# Altium integrated library TI Power Management Battery Management.IntLib: 950 symbols (part 11 of 48)
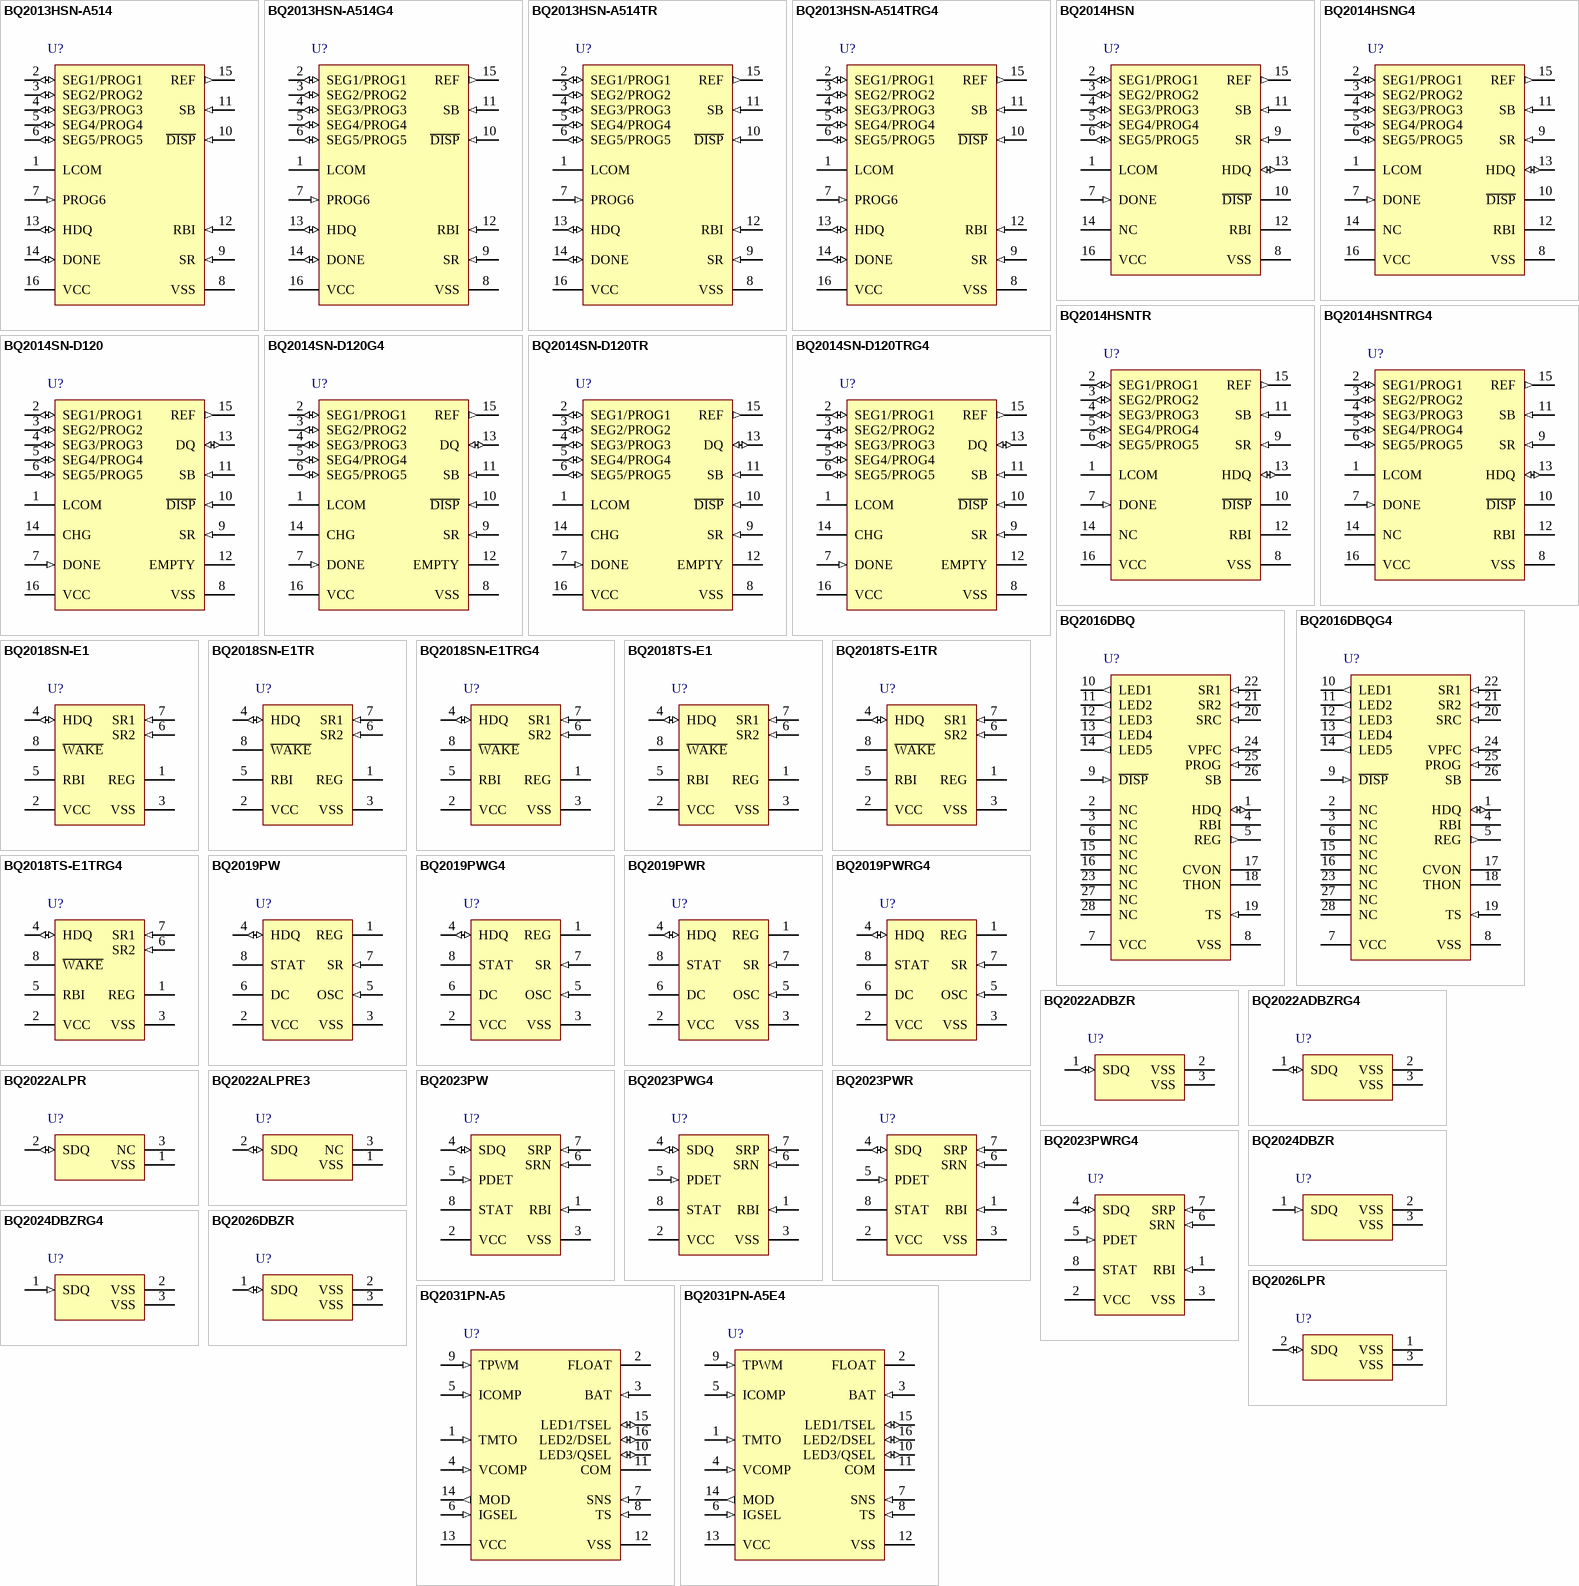
[diagram p44: symbols BQ2013HSN-A514 to BQ2031PN-A5E4]

## BQ2031PN-A5
designator U?
Switch-Mode Lead-Acid Battery Charger with User-Selectable Charge Algorithms, 4.5 V, -20 to 70 degC, 16-pin PDIP (N), Pb-Free (RoHS); PartNumber: BQ2031PN-A5; Manufacturer: Texas Instruments; Lead Acid: Y; SubFamily: Battery Charge Management; Vin(Min)(V): 4.5; DatasheetVersion: SLUS156; PackageVersion: revE, Dec-2002; PackageReference: N16; PackageDescription: 16-Pin Plastic Dual-In-Line Package, Row Spacing 7.62 mm, Pitch 2.54 mm; Supplier 1: Digi-Key; Supplier Part Number 1: 296-9349-5-ND; Supplier Part Number 3: 595-BQ2031PN-A5; Eco-Plan: Pb-Free (RoHS); Li-Ion: N; Li-Polymer: N; NiCd: N; NiMH: N; Over Voltage Protection: N; Mounting Technology: Through Hole; Code_JEDEC: MS-001*; ComponentLink1Description: Datasheet; ComponentLink1URL: http://www.ti.com/general/docs/lit/getliterature.tsp?genericPartNumber=BQ2031&fileType=pdf
footprint N16 (DIP, 16-Leads, Row Spacing 7.62mm, Pitch 2.54mm, Body 19.3x6.4mm)
pins: 1 TMTO (in) "This input sets the maximum charge time.The resistor and capacitor values are determined using equation 6. Figure 9 shows the resistor/capacitor connection.", 2 FLOAT (oc) "This open-drain output uses an external resistor divider network to control the BAT input voltage threshold (VFLT) for the float charge regulation. See Figure 1.", 3 BAT (in) "BAT is the battery voltage sense input. This potential is generally developed using a highimpedance resistor divider network connected between the positive and the negative terminals of the battery. See Figure 6 and equation (See Datasheet)", 4 VCOMP (in) "This input uses an external C or R-C network for voltage loop stability.", 5 ICOMP (in) "This input uses an external C or R-C network for current loop stability.", 6 IGSEL (in) "This three-state input is used to set IMIN for fast charge termination in the Two-Step Voltage algorithm and for maintenance current regulation in the Two-Step Current algorithm.See Tables 3 and 4.", 7 SNS (in) "Battery current is sensed via the voltage developed on this pin by an external sense resistor,RSNS, connected in series with the low side of the battery. See equation 8.", 8 TS (in) "This input is for an external battery temperature monitoring thermistor or probe. An external resistor divider network sets the lower and upper temperature thresholds.See Figures 7 and 8 and equations 4 and 5.", 9 TPWM (in) "This input uses an external timing capacitor to ground the pulse-width modulation (PWM) frequency. See equation 9.", 10 LED3/QSEL (io) "These charger status output drivers are for the direct drive of the LED display. Display modes are shown in Table 2. These outputs are tri-stated during initialization so that QSEL,TSEL, and DSEL can be read./With QSEL, (See Datasheet)", 11 COM (hiz) "Common output for LED1-3. This output is in a high-impedance state during initialization to read program inputs on TSEL,QSEL, and DSEL.", 12 VSS (power) "Ground", 13 VCC (power) "5.0V, +/- 10% power", 14 MOD (out) "MOD is a pulse-width modulated push/pull output that is used to control the charging current to the battery. MOD switches high to enable current flow and low to inhibit current flow.", 15 LED1/TSEL (io) "These charger status output drivers are for the direct drive of the LED display. Display modes are shown in Table 2. These outputs are tri-stated during initialization so that QSEL,TSEL, and DSEL can be read./With TSEL, (See Datasheet)", 16 LED2/DSEL (io) "These charger status output drivers are for the direct drive of the LED display. Display modes are shown in Table 2. These outputs are tri-stated during initialization so that QSEL,TSEL, and DSEL can be read./This (See Datasheet)"

## BQ2031PN-A5E4
designator U?
Switch-Mode Lead-Acid Battery Charger with User-Selectable Charge Algorithms, 4.5 V, -20 to 70 degC, 16-pin PDIP (N), Pb-Free (RoHS); PartNumber: BQ2031PN-A5E4; Manufacturer: Texas Instruments; Lead Acid: Y; SubFamily: Battery Charge Management; Vin(Min)(V): 4.5; DatasheetVersion: SLUS156; PackageVersion: revE, Dec-2002; PackageReference: N16; PackageDescription: 16-Pin Plastic Dual-In-Line Package, Row Spacing 7.62 mm, Pitch 2.54 mm; Supplier 1: Digi-Key; Supplier Part Number 1: BQ2031PN-A5E4-ND; Supplier Part Number 3: 595-BQ2031PN-A5E4; Eco-Plan: Pb-Free (RoHS); Li-Ion: N; Li-Polymer: N; NiCd: N; NiMH: N; Over Voltage Protection: N; Mounting Technology: Through Hole; Code_JEDEC: MS-001*; ComponentLink1Description: Datasheet; ComponentLink1URL: http://www.ti.com/general/docs/lit/getliterature.tsp?genericPartNumber=BQ2031&fileType=pdf
footprint N16 (DIP, 16-Leads, Row Spacing 7.62mm, Pitch 2.54mm, Body 19.3x6.4mm)
pins: 1 TMTO (in) "This input sets the maximum charge time.The resistor and capacitor values are determined using equation 6. Figure 9 shows the resistor/capacitor connection.", 2 FLOAT (oc) "This open-drain output uses an external resistor divider network to control the BAT input voltage threshold (VFLT) for the float charge regulation. See Figure 1.", 3 BAT (in) "BAT is the battery voltage sense input. This potential is generally developed using a highimpedance resistor divider network connected between the positive and the negative terminals of the battery. See Figure 6 and equation (See Datasheet)", 4 VCOMP (in) "This input uses an external C or R-C network for voltage loop stability.", 5 ICOMP (in) "This input uses an external C or R-C network for current loop stability.", 6 IGSEL (in) "This three-state input is used to set IMIN for fast charge termination in the Two-Step Voltage algorithm and for maintenance current regulation in the Two-Step Current algorithm.See Tables 3 and 4.", 7 SNS (in) "Battery current is sensed via the voltage developed on this pin by an external sense resistor,RSNS, connected in series with the low side of the battery. See equation 8.", 8 TS (in) "This input is for an external battery temperature monitoring thermistor or probe. An external resistor divider network sets the lower and upper temperature thresholds.See Figures 7 and 8 and equations 4 and 5.", 9 TPWM (in) "This input uses an external timing capacitor to ground the pulse-width modulation (PWM) frequency. See equation 9.", 10 LED3/QSEL (io) "These charger status output drivers are for the direct drive of the LED display. Display modes are shown in Table 2. These outputs are tri-stated during initialization so that QSEL,TSEL, and DSEL can be read./With QSEL, (See Datasheet)", 11 COM (hiz) "Common output for LED1-3. This output is in a high-impedance state during initialization to read program inputs on TSEL,QSEL, and DSEL.", 12 VSS (power) "Ground", 13 VCC (power) "5.0V, +/- 10% power", 14 MOD (out) "MOD is a pulse-width modulated push/pull output that is used to control the charging current to the battery. MOD switches high to enable current flow and low to inhibit current flow.", 15 LED1/TSEL (io) "These charger status output drivers are for the direct drive of the LED display. Display modes are shown in Table 2. These outputs are tri-stated during initialization so that QSEL,TSEL, and DSEL can be read./With TSEL, (See Datasheet)", 16 LED2/DSEL (io) "These charger status output drivers are for the direct drive of the LED display. Display modes are shown in Table 2. These outputs are tri-stated during initialization so that QSEL,TSEL, and DSEL can be read./This (See Datasheet)"

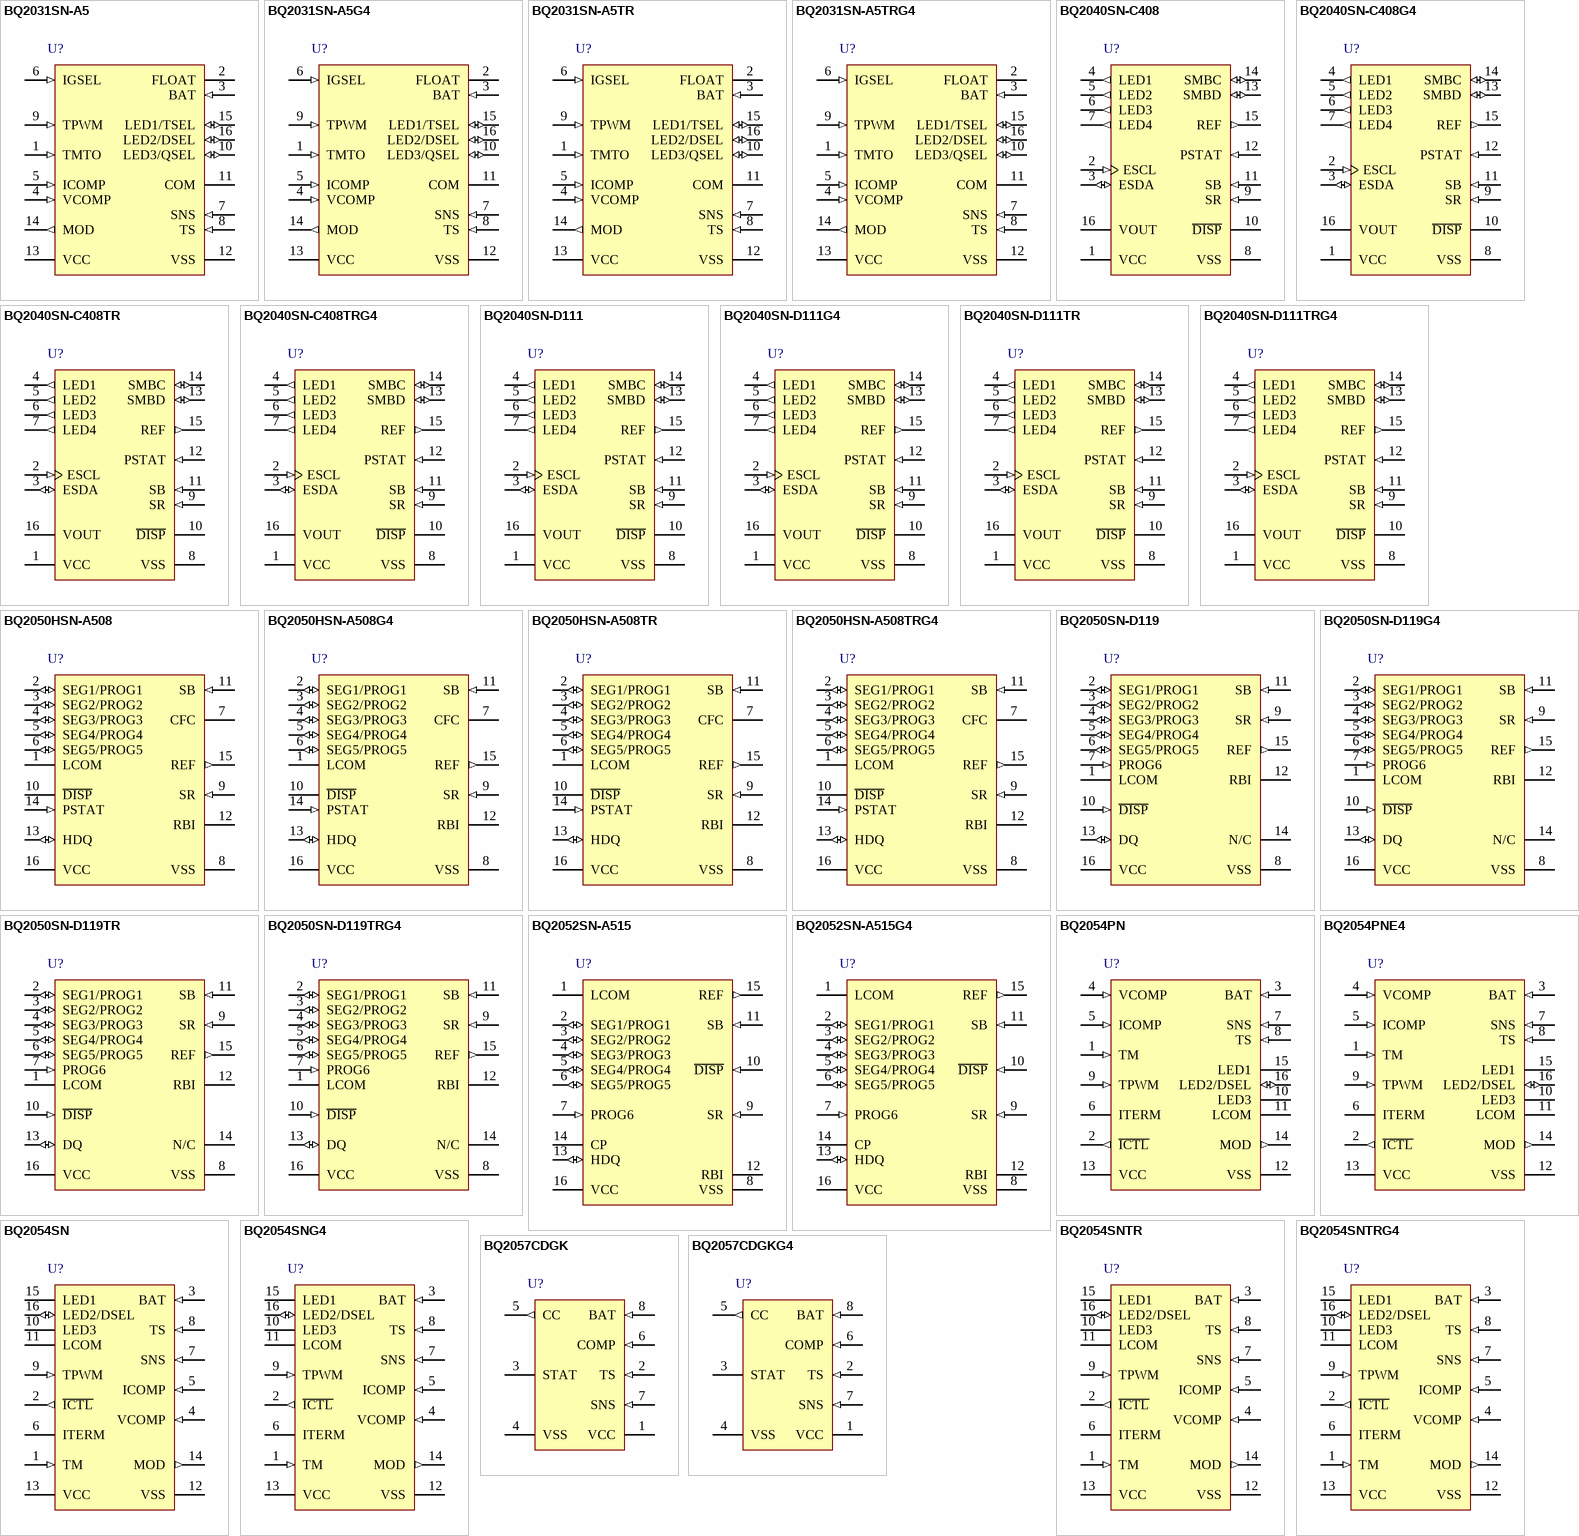
[diagram p7: symbols BQ2031SN-A5 to BQ2057CDGKG4]

## BQ2031SN-A5
designator U?
Switch-Mode Lead-Acid Battery Charger with User-Selectable Charge Algorithms, 4.5 V, -20 to 70 degC, 16-pin PDIP (N), Pb-Free (RoHS); PartNumber: BQ2031SN-A5; Manufacturer: Texas Instruments; Eco-Plan: Green (RoHS & no Sb/Br); Lead Acid: Y; SubFamily: Battery Charge Management; Vin(Min)(V): 4.5; DatasheetVersion: SLUS156; PackageVersion: revM, Jun-2011; PackageReference: D16; PackageDescription: 16-Pin Plastic Small Outline Integrated Circuit, 9.9 x 3.9 mm, Pitch 1.27 mm Pitch; Supplier 1: Digi-Key; Supplier Part Number 1: 296-9350-5-ND; Supplier Part Number 3: 36K7136; Li-Ion: N; Li-Polymer: N; NiCd: N; NiMH: N; Over Voltage Protection: N; Mounting Technology: Surface Mount; Code_JEDEC: MS-012AC; ComponentLink1Description: Datasheet; ComponentLink1URL: http://www.ti.com/general/docs/lit/getliterature.tsp?genericPartNumber=BQ2031&fileType=pdf
footprint D16_N (SOIC, 16-Leads, Body 9.9x3.9mm, Pitch 1.27mm, IPC Medium Density)
footprint D16_L (SOIC, 16-Leads, Body 9.9x3.9mm, Pitch 1.27mm, IPC High Density)
footprint D16_M (SOIC, 16-Leads, Body 9.9x3.9mm, Pitch 1.27mm, IPC Low Density)
pins: 1 TMTO (in) "This input sets the maximum charge time.The resistor and capacitor values are determined using equation 6. Figure 9 shows the resistor/capacitor connection.", 2 FLOAT (oc) "This open-drain output uses an external resistor divider network to control the BAT input voltage threshold (VFLT) for the float charge regulation. See Figure 1.", 3 BAT (in) "BAT is the battery voltage sense input. This potential is generally developed using a highimpedance resistor divider network connected between the positive and the negative terminals of the battery. See Figure 6 and equation (See Datasheet)", 4 VCOMP (in) "This input uses an external C or R-C network for voltage loop stability.", 5 ICOMP (in) "This input uses an external C or R-C network for current loop stability.", 6 IGSEL (in) "This three-state input is used to set IMIN for fast charge termination in the Two-Step Voltage algorithm and for maintenance current regulation in the Two-Step Current algorithm.See Tables 3 and 4.", 7 SNS (in) "Battery current is sensed via the voltage developed on this pin by an external sense resistor,RSNS, connected in series with the low side of the battery. See equation 8.", 8 TS (in) "This input is for an external battery temperature monitoring thermistor or probe. An external resistor divider network sets the lower and upper temperature thresholds.See Figures 7 and 8 and equations 4 and 5.", 9 TPWM (in) "This input uses an external timing capacitor to ground the pulse-width modulation (PWM) frequency. See equation 9.", 10 LED3/QSEL (io) "These charger status output drivers are for the direct drive of the LED display. Display modes are shown in Table 2. These outputs are tri-stated during initialization so that QSEL,TSEL, and DSEL can be read./With QSEL, (See Datasheet)", 11 COM (hiz) "Common output for LED1-3. This output is in a high-impedance state during initialization to read program inputs on TSEL,QSEL, and DSEL.", 12 VSS (power) "Ground", 13 VCC (power) "5.0V, +/- 10% power", 14 MOD (out) "MOD is a pulse-width modulated push/pull output that is used to control the charging current to the battery. MOD switches high to enable current flow and low to inhibit current flow.", 15 LED1/TSEL (io) "These charger status output drivers are for the direct drive of the LED display. Display modes are shown in Table 2. These outputs are tri-stated during initialization so that QSEL,TSEL, and DSEL can be read./With TSEL, (See Datasheet)", 16 LED2/DSEL (io) "These charger status output drivers are for the direct drive of the LED display. Display modes are shown in Table 2. These outputs are tri-stated during initialization so that QSEL,TSEL, and DSEL can be read./This (See Datasheet)"

## BQ2031SN-A5G4
designator U?
Switch-Mode Lead-Acid Battery Charger with User-Selectable Charge Algorithms, 4.5 V, -20 to 70 degC, 16-pin PDIP (N), Pb-Free (RoHS); PartNumber: BQ2031SN-A5G4; Manufacturer: Texas Instruments; Eco-Plan: Green (RoHS & no Sb/Br); Lead Acid: Y; SubFamily: Battery Charge Management; Vin(Min)(V): 4.5; DatasheetVersion: SLUS156; PackageVersion: revM, Jun-2011; PackageReference: D16; PackageDescription: 16-Pin Plastic Small Outline Integrated Circuit, 9.9 x 3.9 mm, Pitch 1.27 mm Pitch; Supplier 1: Digi-Key; Supplier Part Number 1: BQ2031SN-A5G4-ND; Supplier Part Number 3: 595-BQ2031SN-A5G4; Li-Ion: N; Li-Polymer: N; NiCd: N; NiMH: N; Over Voltage Protection: N; Mounting Technology: Surface Mount; Code_JEDEC: MS-012AC; ComponentLink1Description: Datasheet; ComponentLink1URL: http://www.ti.com/general/docs/lit/getliterature.tsp?genericPartNumber=BQ2031&fileType=pdf
footprint D16_N (SOIC, 16-Leads, Body 9.9x3.9mm, Pitch 1.27mm, IPC Medium Density)
footprint D16_L (SOIC, 16-Leads, Body 9.9x3.9mm, Pitch 1.27mm, IPC High Density)
footprint D16_M (SOIC, 16-Leads, Body 9.9x3.9mm, Pitch 1.27mm, IPC Low Density)
pins: 1 TMTO (in) "This input sets the maximum charge time.The resistor and capacitor values are determined using equation 6. Figure 9 shows the resistor/capacitor connection.", 2 FLOAT (oc) "This open-drain output uses an external resistor divider network to control the BAT input voltage threshold (VFLT) for the float charge regulation. See Figure 1.", 3 BAT (in) "BAT is the battery voltage sense input. This potential is generally developed using a highimpedance resistor divider network connected between the positive and the negative terminals of the battery. See Figure 6 and equation (See Datasheet)", 4 VCOMP (in) "This input uses an external C or R-C network for voltage loop stability.", 5 ICOMP (in) "This input uses an external C or R-C network for current loop stability.", 6 IGSEL (in) "This three-state input is used to set IMIN for fast charge termination in the Two-Step Voltage algorithm and for maintenance current regulation in the Two-Step Current algorithm.See Tables 3 and 4.", 7 SNS (in) "Battery current is sensed via the voltage developed on this pin by an external sense resistor,RSNS, connected in series with the low side of the battery. See equation 8.", 8 TS (in) "This input is for an external battery temperature monitoring thermistor or probe. An external resistor divider network sets the lower and upper temperature thresholds.See Figures 7 and 8 and equations 4 and 5.", 9 TPWM (in) "This input uses an external timing capacitor to ground the pulse-width modulation (PWM) frequency. See equation 9.", 10 LED3/QSEL (io) "These charger status output drivers are for the direct drive of the LED display. Display modes are shown in Table 2. These outputs are tri-stated during initialization so that QSEL,TSEL, and DSEL can be read./With QSEL, (See Datasheet)", 11 COM (hiz) "Common output for LED1-3. This output is in a high-impedance state during initialization to read program inputs on TSEL,QSEL, and DSEL.", 12 VSS (power) "Ground", 13 VCC (power) "5.0V, +/- 10% power", 14 MOD (out) "MOD is a pulse-width modulated push/pull output that is used to control the charging current to the battery. MOD switches high to enable current flow and low to inhibit current flow.", 15 LED1/TSEL (io) "These charger status output drivers are for the direct drive of the LED display. Display modes are shown in Table 2. These outputs are tri-stated during initialization so that QSEL,TSEL, and DSEL can be read./With TSEL, (See Datasheet)", 16 LED2/DSEL (io) "These charger status output drivers are for the direct drive of the LED display. Display modes are shown in Table 2. These outputs are tri-stated during initialization so that QSEL,TSEL, and DSEL can be read./This (See Datasheet)"

## BQ2031SN-A5TR
designator U?
Switch-Mode Lead-Acid Battery Charger with User-Selectable Charge Algorithms, 4.5 V, -20 to 70 degC, 16-pin PDIP (N), Pb-Free (RoHS); PartNumber: BQ2031SN-A5TR; Manufacturer: Texas Instruments; Eco-Plan: Green (RoHS & no Sb/Br); Lead Acid: Y; SubFamily: Battery Charge Management; Vin(Min)(V): 4.5; DatasheetVersion: SLUS156; PackageVersion: revM, Jun-2011; PackageReference: D16; PackageDescription: 16-Pin Plastic Small Outline Integrated Circuit, 9.9 x 3.9 mm, Pitch 1.27 mm Pitch; Supplier 1: Digi-Key; Supplier Part Number 1: 296-30430-2-ND; Supplier Part Number 3: 74C7570; Li-Ion: N; Li-Polymer: N; NiCd: N; NiMH: N; Over Voltage Protection: N; Mounting Technology: Surface Mount; Code_JEDEC: MS-012AC; ComponentLink1Description: Datasheet; ComponentLink1URL: http://www.ti.com/general/docs/lit/getliterature.tsp?genericPartNumber=BQ2031&fileType=pdf
footprint D16_N (SOIC, 16-Leads, Body 9.9x3.9mm, Pitch 1.27mm, IPC Medium Density)
footprint D16_L (SOIC, 16-Leads, Body 9.9x3.9mm, Pitch 1.27mm, IPC High Density)
footprint D16_M (SOIC, 16-Leads, Body 9.9x3.9mm, Pitch 1.27mm, IPC Low Density)
pins: 1 TMTO (in) "This input sets the maximum charge time.The resistor and capacitor values are determined using equation 6. Figure 9 shows the resistor/capacitor connection.", 2 FLOAT (oc) "This open-drain output uses an external resistor divider network to control the BAT input voltage threshold (VFLT) for the float charge regulation. See Figure 1.", 3 BAT (in) "BAT is the battery voltage sense input. This potential is generally developed using a highimpedance resistor divider network connected between the positive and the negative terminals of the battery. See Figure 6 and equation (See Datasheet)", 4 VCOMP (in) "This input uses an external C or R-C network for voltage loop stability.", 5 ICOMP (in) "This input uses an external C or R-C network for current loop stability.", 6 IGSEL (in) "This three-state input is used to set IMIN for fast charge termination in the Two-Step Voltage algorithm and for maintenance current regulation in the Two-Step Current algorithm.See Tables 3 and 4.", 7 SNS (in) "Battery current is sensed via the voltage developed on this pin by an external sense resistor,RSNS, connected in series with the low side of the battery. See equation 8.", 8 TS (in) "This input is for an external battery temperature monitoring thermistor or probe. An external resistor divider network sets the lower and upper temperature thresholds.See Figures 7 and 8 and equations 4 and 5.", 9 TPWM (in) "This input uses an external timing capacitor to ground the pulse-width modulation (PWM) frequency. See equation 9.", 10 LED3/QSEL (io) "These charger status output drivers are for the direct drive of the LED display. Display modes are shown in Table 2. These outputs are tri-stated during initialization so that QSEL,TSEL, and DSEL can be read./With QSEL, (See Datasheet)", 11 COM (hiz) "Common output for LED1-3. This output is in a high-impedance state during initialization to read program inputs on TSEL,QSEL, and DSEL.", 12 VSS (power) "Ground", 13 VCC (power) "5.0V, +/- 10% power", 14 MOD (out) "MOD is a pulse-width modulated push/pull output that is used to control the charging current to the battery. MOD switches high to enable current flow and low to inhibit current flow.", 15 LED1/TSEL (io) "These charger status output drivers are for the direct drive of the LED display. Display modes are shown in Table 2. These outputs are tri-stated during initialization so that QSEL,TSEL, and DSEL can be read./With TSEL, (See Datasheet)", 16 LED2/DSEL (io) "These charger status output drivers are for the direct drive of the LED display. Display modes are shown in Table 2. These outputs are tri-stated during initialization so that QSEL,TSEL, and DSEL can be read./This (See Datasheet)"

## BQ2031SN-A5TRG4
designator U?
Switch-Mode Lead-Acid Battery Charger with User-Selectable Charge Algorithms, 4.5 V, -20 to 70 degC, 16-pin PDIP (N), Pb-Free (RoHS); PartNumber: BQ2031SN-A5TRG4; Manufacturer: Texas Instruments; Eco-Plan: Green (RoHS & no Sb/Br); Lead Acid: Y; SubFamily: Battery Charge Management; Vin(Min)(V): 4.5; DatasheetVersion: SLUS156; PackageVersion: revM, Jun-2011; PackageReference: D16; PackageDescription: 16-Pin Plastic Small Outline Integrated Circuit, 9.9 x 3.9 mm, Pitch 1.27 mm Pitch; Supplier 1: Digi-Key; Supplier Part Number 1: BQ2031SN-A5TRG4-ND; Supplier Part Number 3: 595-BQ2031SN-A5TRG4; Li-Ion: N; Li-Polymer: N; NiCd: N; NiMH: N; Over Voltage Protection: N; Mounting Technology: Surface Mount; Code_JEDEC: MS-012AC; ComponentLink1Description: Datasheet; ComponentLink1URL: http://www.ti.com/general/docs/lit/getliterature.tsp?genericPartNumber=BQ2031&fileType=pdf
footprint D16_N (SOIC, 16-Leads, Body 9.9x3.9mm, Pitch 1.27mm, IPC Medium Density)
footprint D16_L (SOIC, 16-Leads, Body 9.9x3.9mm, Pitch 1.27mm, IPC High Density)
footprint D16_M (SOIC, 16-Leads, Body 9.9x3.9mm, Pitch 1.27mm, IPC Low Density)
pins: 1 TMTO (in) "This input sets the maximum charge time.The resistor and capacitor values are determined using equation 6. Figure 9 shows the resistor/capacitor connection.", 2 FLOAT (oc) "This open-drain output uses an external resistor divider network to control the BAT input voltage threshold (VFLT) for the float charge regulation. See Figure 1.", 3 BAT (in) "BAT is the battery voltage sense input. This potential is generally developed using a highimpedance resistor divider network connected between the positive and the negative terminals of the battery. See Figure 6 and equation (See Datasheet)", 4 VCOMP (in) "This input uses an external C or R-C network for voltage loop stability.", 5 ICOMP (in) "This input uses an external C or R-C network for current loop stability.", 6 IGSEL (in) "This three-state input is used to set IMIN for fast charge termination in the Two-Step Voltage algorithm and for maintenance current regulation in the Two-Step Current algorithm.See Tables 3 and 4.", 7 SNS (in) "Battery current is sensed via the voltage developed on this pin by an external sense resistor,RSNS, connected in series with the low side of the battery. See equation 8.", 8 TS (in) "This input is for an external battery temperature monitoring thermistor or probe. An external resistor divider network sets the lower and upper temperature thresholds.See Figures 7 and 8 and equations 4 and 5.", 9 TPWM (in) "This input uses an external timing capacitor to ground the pulse-width modulation (PWM) frequency. See equation 9.", 10 LED3/QSEL (io) "These charger status output drivers are for the direct drive of the LED display. Display modes are shown in Table 2. These outputs are tri-stated during initialization so that QSEL,TSEL, and DSEL can be read./With QSEL, (See Datasheet)", 11 COM (hiz) "Common output for LED1-3. This output is in a high-impedance state during initialization to read program inputs on TSEL,QSEL, and DSEL.", 12 VSS (power) "Ground", 13 VCC (power) "5.0V, +/- 10% power", 14 MOD (out) "MOD is a pulse-width modulated push/pull output that is used to control the charging current to the battery. MOD switches high to enable current flow and low to inhibit current flow.", 15 LED1/TSEL (io) "These charger status output drivers are for the direct drive of the LED display. Display modes are shown in Table 2. These outputs are tri-stated during initialization so that QSEL,TSEL, and DSEL can be read./With TSEL, (See Datasheet)", 16 LED2/DSEL (io) "These charger status output drivers are for the direct drive of the LED display. Display modes are shown in Table 2. These outputs are tri-stated during initialization so that QSEL,TSEL, and DSEL can be read./This (See Datasheet)"
